# Altium footprint library hphonglib.PcbLib: 1250 footprints (part 4 of 79)
Each footprint in its own frame and in the unit in brackets; x right, y up, seen from the top. Pads: shape width x height; smd on the part's side, far side on the other; paste and mask are expansions set on the pad; w line width, h text height; cw(c..) or ccw(c..) is an arc to the next point about the centre after c.
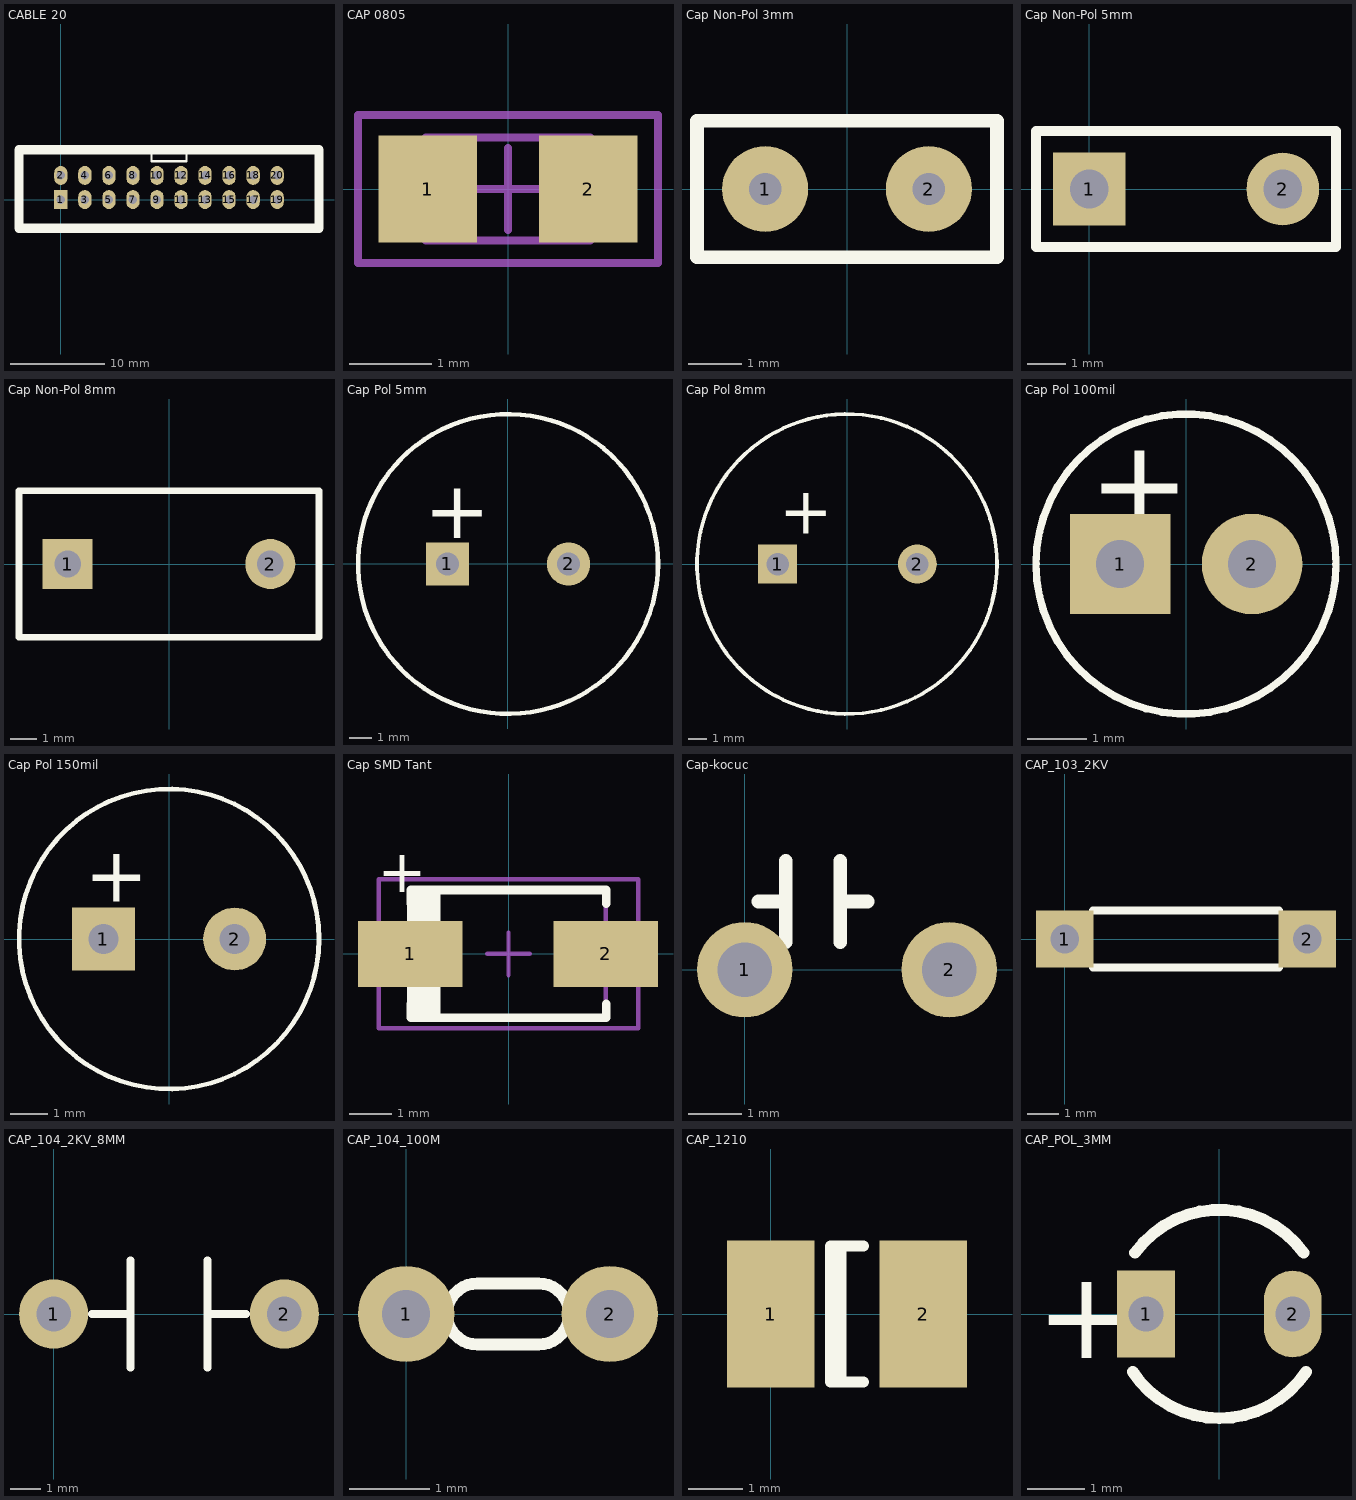
[diagram p3: the footprints below, top view; thin cyan lines are the x and y axes]

## CABLE 20 [mm] "Connector; Header; 5x2 Position"
pads (20):
  rect 1.4x2 hole 0.9: 1(0,0)
  oval 1.4x2 hole 0.9: 2(0,2.54) 3(2.54,0) 4(2.54,2.54) 5(5.08,0) 6(5.08,2.54) 7(7.62,0) 8(7.62,2.54) 9(10.16,0) 10(10.16,2.54) 11(12.7,0) 12(12.7,2.54) 13(15.24,0) 14(15.24,2.54) 15(17.78,0) 16(17.78,2.54) 17(20.32,0) 18(20.32,2.54) 19(22.86,0) 20(22.86,2.54)
Top Overlay:
  lines w0.254: 9.576,5.27 9.576,4.064 11.43,4.064 13.284,4.064 13.284,5.27
  lines w1: 8.28,-3.048 27.28,-3.048 27.28,5.27 8.28,5.27 ; 14.58,-3.048 -4.42,-3.048 -4.42,5.27 14.58,5.27
3D body "User Library-HDB-20.step": height 9.3, standoff -2.5, extent -5.02,-3.63 27.88,5.77

## CAP 0805 [mm] "Molded Capacitor, 2-Leads, Body 2,0x1,3mm, IPC Medium Density"
height 1.8
pads (2):
  rect 1.2x1.3 smd: 1(-0.975,0) 2(0.975,0)
Mechanical 13:
  lines w0.1: -1,-0.625 -1,0.625 1,0.625 1,-0.625 -1,-0.625
Mechanical 15:
  lines w0.1: -0.5,0 0.5,0 ; 0,-0.5 0,0.5 ; -1.825,-0.9 -1.825,0.9 1.825,0.9 1.825,-0.9 -1.825,-0.9
3D body: height 1.8, standoff 0, extent -1,-0.625 1,0.625

## Cap Non-Pol 3mm [mm] "Capacitor, Radial; Body 5.6 x 2.5 mm (L x W typ); Pin Spacing 3 mm (typ); Solder Pad 35mil"
pads (2):
  round 1.6 hole 0.6: 1(-1.524,0) 2(1.524,0)
Top Overlay:
  lines w0.254: -2.794,-1.27 -2.794,1.27 2.794,1.27 2.794,-1.27 -2.794,-1.27
3D body "User Library-Cap 100n.step": height 6.22, standoff -1.7, extent -2.919,-0.833 2.919,0.864

## Cap Non-Pol 5mm [mil] "Capacitor, Radial; Body 8 x 3 mm (L x W typ); Pin Spacing 5 mm (typ); Solder Pad 35mil"
pads (2):
  rect 75x75 hole 40: 1(0,0)
  round 75 hole 40: 2(200,0)
Top Overlay:
  lines w10: -55,-60 255,-60 255,60 -55,60 -55,-60
3D body "WIMA RM5 7.2x3x7.5.step": height 296.28, standoff -97.43, extent -41.73,-59 241.73,59.11

## Cap Non-Pol 8mm [mil] "Capacitor, Radial; Body 11.4 x 5.6 mm (L x W typ); Pin Spacing 8 mm (typ); Solder Pad 35mil"
pads (2):
  rect 75x75 hole 40: 1(-152,0)
  round 75 hole 40: 2(152,0)
Top Overlay:
  lines w10: -225,-110 -225,110 225,110 225,-110 -225,-110
3D body "WIMA RM7.5 10.3x5x12.5.step": height 492.13, standoff -98.43, extent -202.76,-98.5 202.76,98.35

## Cap Pol 5mm [mil] "Capacitor, Electrolytic, Radial; Body 5 x 6.8 mm (Dia.xH typ); Pin Spacing 2 mm (typ); Solder Pad 35mil"
pads (2):
  rect 75x75 hole 40: 1(-105,0)
  round 75 hole 40: 2(105,0)
Top Overlay:
  circle w7.87: c0,0 r260
  text "+" at -145,45 h100
3D body "User Library-Capacitor Radial Electrolitic-500-1250x2000.step": height 787.8, standoff -106.3, extent -245.06,-246.06 245.35,246.07

## Cap Pol 8mm [mil] "Capacitor, Electrolytic, Radial; Body 5 x 6.8 mm (Dia.xH typ); Pin Spacing 2 mm (typ); Solder Pad 35mil"
pads (2):
  rect 83x83 hole 48: 1(-148,0)
  round 83 hole 48: 2(150,0)
Top Overlay:
  circle w7.87: c0,0 r320
  text "+" at -145,65 h100
3D body "User Library-Capacitor Radial Electrolitic-750-1600x2500.step": height 984.65, standoff -106.3, extent -313.95,-314.96 313.66,314.96

## Cap Pol 100mil [mil] "Capacitor, Electrolytic, Radial; Body 5 x 6.8 mm (Dia.xH typ); Pin Spacing 2 mm (typ); Solder Pad 35mil"
pads (2):
  rect 67x67 hole 32: 1(-44,0)
  round 67 hole 32: 2(44,0)
Top Overlay:
  circle w5: c0,0 r100
  text "+" at -65,25 h59.06
3D body "User Library-Capacitor Radial Electrolitic-200-500x1150.step": height 89.3, standoff -470.15, extent -98.42,-98.42 97.98,98.44

## Cap Pol 150mil [mil] "Capacitor, Electrolytic, Radial; Body 5 x 5 mm (Dia.xH typ); Pin Spacing 5 mm (typ); Solder Pad 35mil"
pads (2):
  rect 67x67 hole 32: 1(-70,0)
  round 67 hole 32: 2(70,0)
Top Overlay:
  circle w5: c0,0 r160
  text "+" at -90,40 h59.06
3D body "User Library-Capacitor Radial Electrolitic-350-800x1150.step": height 453.15, standoff -106.3, extent -156.98,-157.48 157.02,157.49

## Cap SMD Tant [mm]
height 2.4
pads (2):
  rect 2.45x1.55 smd: 1(-2.311,0) 2(2.286,0)
Top Overlay:
  rectangle: -2.388,-1.499 -1.6,1.5
  lines w0.2: -2.3,-1.175 -2.3,-1.5 2.3,-1.5 2.3,-1.175 ; -2.3,1.175 -2.3,1.5 2.3,1.5 2.3,1.175
  text "+" at -3.073,1.448 h1
Mechanical 13:
  rectangle: -2.285,-1.46 -1.67,1.46
  lines w0.1: -2.285,-1.46 2.285,-1.46 2.285,1.46 -2.285,1.46 -2.285,-1.46
Mechanical 15:
  lines w0.1: -0.5,0 0.5,0 ; 0,-0.5 0,0.5 ; -3.05,-1.75 3.05,-1.75 3.05,1.75 -3.05,1.75 -3.05,-1.75
3D body: height 2.4, standoff 0, extent -2.285,-1.46 2.285,1.46

## Cap-kocuc [mil]
pads (2):
  round 70 hole 40: 1(0,0) 2(150,0)
Top Overlay:
  lines w10: 10,50 30,50 ; 30,20 30,80 ; 70,20 70,80 ; 70,50 90,50
3D body "SW3dPS-Cap 100n.STEP": height 265, standoff -46.85, extent -64.86,-33.39 165.01,33.4

## CAP_103_2KV [mm]
pads (2):
  rect 1.8x1.8 hole 0.9: 1(0,0) 2(7.62,0)
Top Overlay:
  lines w0.254: 0.889,-0.889 6.731,-0.889 ; 0.889,0.889 6.731,0.889
3D body "User Library-Panasonic ECK-A3D102KBP.step": height 9.03, standoff -4.16, extent -0.19,-1.198 7.811,1.195

## CAP_104_2KV_8MM [mil]
pads (2):
  round 90 hole 45: 1(0,0) 2(300,0)
Top Overlay:
  lines w10: 50,0 100,0 ; 100,-70 100,70 ; 200,-70 200,70 ; 200,0 250,0
3D body "SW3dPS-Panasonic ECK-A3D102KBP.STEP": height 419.15, standoff -100, extent -7.49,-47.15 307.51,47.05

## CAP_104_100M [mm] "Tu gom mini"
pads (2):
  round 1.2 hole 0.6: 1(0,0) 2(2.54,0)
Top Overlay:
  lines w0.15: 0.889,-0.381 cw(c0.889,0) 0.889,0.381 1.651,0.381 cw(c1.651,0) 1.651,-0.381 0.889,-0.381
3D body "User Library-Cap 100n.step": height 6.12, standoff -1.8, extent -1.647,-0.848 4.191,0.848

## CAP_1210 [mm] "Chip Capacitor; Body 3.2 x 2.5 mm (LxW typ)"
height 1.35
pads (2):
  rect 1.6x2.7 smd: 1(0,0) 2(2.8,0)
Top Overlay:
  lines w0.2: 1.29,-1.25 1.29,1.25 ; 1.7,-1.25 1.1,-1.25 1.1,1.25 1.7,1.25

## CAP_POL_3MM [mm]
pads (2):
  rect 1x1.5 hole 0.6: 1(-1.27,0)
  oval 1x1.5 hole 0.6: 2(1.27,0)
Top Overlay:
  lines w0.203: -1.502,-1.001 ccw(c0,0) 1.502,-1.001 ; -1.46,1.062 cw(c0,0) 1.46,1.062
  text "+" at -3.175,-0.762 h1.52
3D body "User Library-Capacitor Radial Electrolitic-150-400x700.step": height 7.01, standoff -2.7, extent -2,-2.025 1.993,1.975